# Altium footprint library Nanjar's Library.PcbLib: 153 footprints (part 10 of 10)
Each footprint in its own frame and in the unit in brackets; x right, y up, seen from the top. Pads: shape width x height; smd on the part's side, far side on the other; paste and mask are expansions set on the pad; w line width, h text height; cw(c..) or ccw(c..) is an arc to the next point about the centre after c.
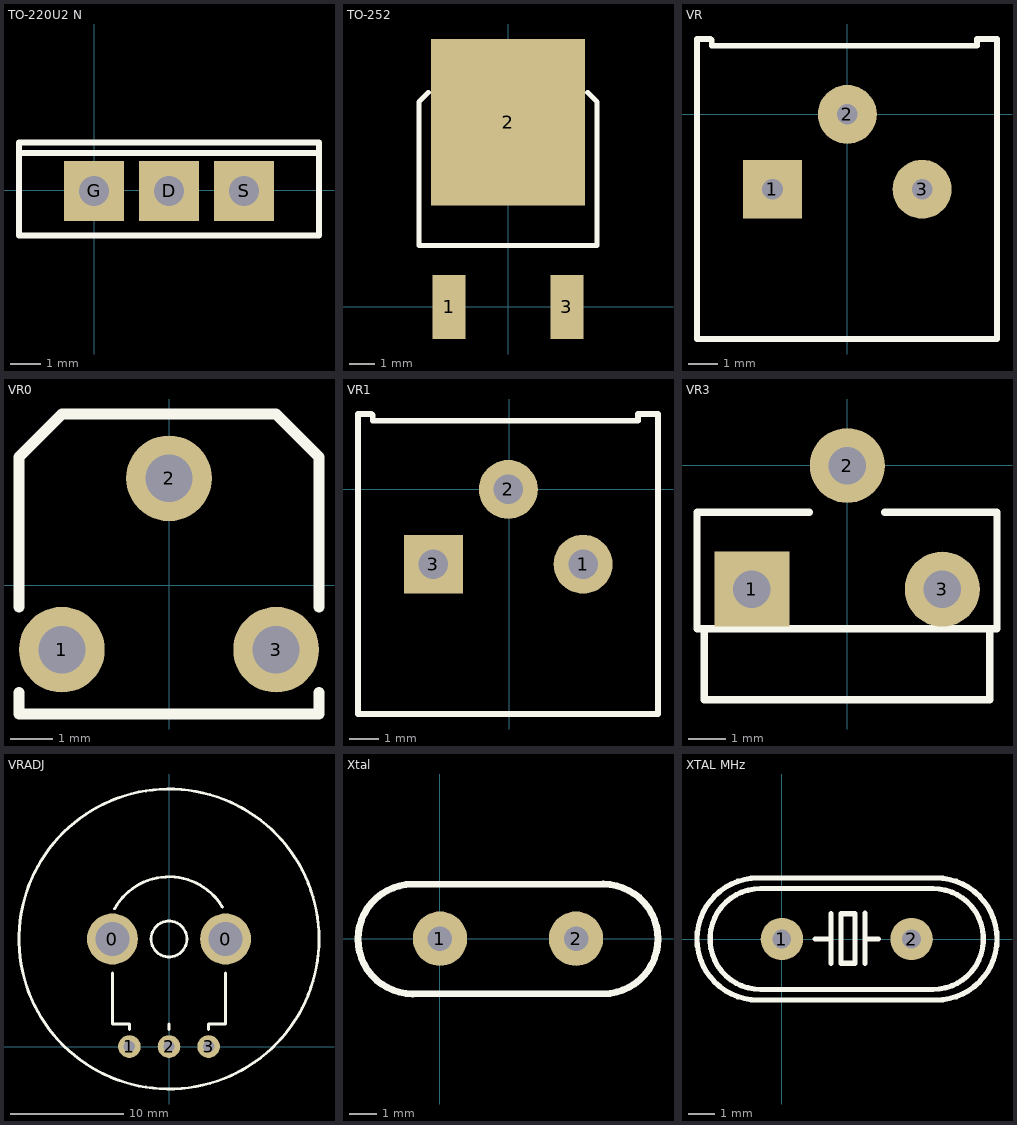
[diagram p9: the footprints below, top view; thin cyan lines are the x and y axes]

## TO-220U2 N [mm]
pads (3):
  rect 2x2 hole 1: D(2.502,-0.01) G(0.002,-0.01) S(5.002,-0.01)
Top Overlay:
  lines w0.2: -2.5,1.25 7.5,1.25 ; -2.5,-1.5 7.5,-1.5 7.5,1.6 -2.5,1.6 -2.5,-1.5

## TO-252 [mm]
pads (3):
  rect 1.3x2.5 smd: 1(-2.3,0) 3(2.3,0)
  rect 6x6.5 smd: 2(0,7.2)
Top Overlay:
  lines w0.2: -3.2,2.4 -2.8,2.4 ; -3.113,8.363 -3.475,8 -3.475,2.4 3.475,2.4 3.475,8 ; 3.113,8.363 3.475,8 ; 3.475,8 3.475,8
3D body "User Library-DPAK_TO-252AA.step": height 2.37, standoff -0.03, extent -3.367,-0.398 3.367,9.702

## VR [mm] "Feed-Through Capacitor; 3 Leads"
pads (3):
  rect 2x2 hole 0.7: 1(-2.54,-2.545)
  round 2 hole 0.7: 2(0,-0.005) 3(2.54,-2.545)
Top Overlay:
  lines w0.2: -4.65,2.55 -5.1,2.55 -5.1,-7.625 5.08,-7.625 ; -4.6,2.525 -4.6,2.325 4.4,2.325 4.4,2.525 4.4,2.55 5.05,2.55 5.075,2.525 ; 5.05,-7.6 5.075,-7.6 5.075,-7.625 5.075,2.55

## VR0 [mm]
pads (3):
  round 2 hole 1.1: 1(-2.5,-1.5) 2(0,2.5) 3(2.5,-1.5)
Top Overlay:
  lines w0.254: -3.5,-2.5 -3.5,-3 3.5,-3 3.5,-2.5 ; -3.5,-0.5 -3.5,3 -2.5,4 ; 3.5,-0.5 3.5,3 2.5,4 -2.5,4 ; -2.5,4 -2.5,4
3D body "User Library-Pot - RES_VAR1.step": height 8, standoff -2.9, extent -3.24,-2.735 3.26,4.315

## VR1 [mm]
pads (3):
  round 2 hole 1: 1(2.515,-2.545) 2(-0.025,-0.005)
  rect 2x2 hole 1: 3(-2.565,-2.545)
Top Overlay:
  lines w0.2: -4.675,2.55 -5.125,2.55 -5.125,-7.625 5.055,-7.625 ; -4.625,2.525 -4.625,2.325 4.375,2.325 4.375,2.525 4.375,2.55 5.025,2.55 5.05,2.525 ; 5.025,-7.6 5.05,-7.6 5.05,-7.625 5.05,2.55

## VR3 [mm] "Feed-Through Capacitor; 3 Leads"
pads (3):
  rect 2x2 hole 1: 1(-2.548,-3.302)
  round 2 hole 1: 2(0,-0.005) 3(2.532,-3.302)
Top Overlay:
  lines w0.2: -3.808,-4.357 -3.808,-6.257 3.792,-6.257 3.792,-4.457 ; -1.008,-1.257 -4.008,-1.257 -4.008,-4.357 3.992,-4.357 3.992,-1.257 0.992,-1.257

## VRADJ [mm]
pads (5):
  round 4.5 hole 3: 0(-5,9.5) 0(5,9.5)
  round 2 hole 1: 1(-3.5,0) 2(0,0) 3(3.5,0)
Top Overlay:
  circle w0.254: c0,9.5 r1.581
  circle w0.254: c0,9.5 r13.25
  lines w0.254: -5,6.5 -5,2 -3.5,2 -3.5,1.5 ; -4.808,12.171 cw(c0,9.5) 4.716,12.33 ; 0,1.5 0,2 ; 3.5,1.5 3.5,2 5,2 5,6.5

## Xtal [mm] "Xtal Can"
pads (2):
  round 2 hole 0.9: 1(0,0) 2(5,0)
Top Overlay:
  lines w0.254: 6,2 -1,2 ccw(c-1,-0.014) -1,-2.028 6,-2.025 ccw(c6,-0.011) 6,2.003

## XTAL MHz [mm]
pads (2):
  round 1.6 hole 0.7: 1(0,0) 2(4.88,0)
Top Overlay:
  lines w0.2: -0.81,-1.9 cw(c-0.81,0) -0.81,1.9 5.685,1.9 ; -0.805,-1.9 5.69,-1.9 ccw(c5.69,0) 5.69,1.9 ; 1.25,0 1.85,0 ; 1.85,-0.914 1.85,0.95 ; 3.125,-0.914 3.125,0.975 ; 3.125,0 3.625,0 ; -0.9,-2.3 cw(c-0.9,0) -0.9,2.3 5.8,2.3 cw(c5.8,0) 5.8,-2.3 -0.9,-2.3 ; 2.225,-0.914 2.75,-0.914 2.75,0.95 2.225,0.95 2.225,-0.914
3D body "User Library-HC-49_LT_THT_16MHz.step": height 3.6, standoff -1.99, extent -3.235,-2.315 8.115,2.335
3D body: height 0.4, standoff -3, extent 4.482,-0.4 5.278,0.398
3D body: height 0.4, standoff -3, extent -0.398,-0.4 0.398,0.398